# Altium schematic symbol library TI - ADC.SchLib: 2198 symbols (part 18 of 130) (continued)
## ADS1222IPWRG4
designator U?
24-Bit ADC with 2-Channel Diffrential Input Multiplexer, -40 to 85 degC, 14-pin SOP (PW14), Green (RoHS & no Sb/Br); Manufacturer: Texas Instruments; PartNumber: ADS1222IPWRG4; # Input Channels: 2; Analog Voltage AV/DD(Max)(V): 5.5; Analog Voltage AV/DD(Min)(V): 2.7; Architecture: Delta-Sigma; ENOB(Bits): 20; Interface: Serial SPI; Resolution(Bits): 24; Sample Rate (max)(SPS): 240; SubFamily: Precision ADC (<=10MSPS); DatasheetVersion: SBAS314B; PackageVersion: 4040064-3/G, 02/2011; PackageReference: PW14; PackageDescription: 14-Pin Plastic Small Outline, Body 5 x 4.4 mm, Pitch 0.65 mm; Supplier 1: Digi-Key; Supplier Part Number 1: ADS8344E-ND; Digital Supply(Max)(V): 5.5; Digital Supply(Min)(V): 2.7; Eco-Plan: Green (RoHS & no Sb/Br); Mounting Technology: Surface Mount; Code_JEDEC: MO-153; ComponentLink1Description: Manufacturer URL; ComponentLink1URL: http://www.ti.com/; ComponentLink2Description: Datasheet; ComponentLink2URL: http://www.ti.com/general/docs/lit/getliterature.tsp?genericPartNumber=ADS1222&fileType=pdf; ComponentLink3Description: Package Specification; ComponentLink3URL: http://www.ti.com/litv/pdf/mpds360
footprint TI-PW14_N (SOP, 14-Leads, Body 5x4.4mm, Pitch 0.65mm, IPC Medium Density)
footprint TI-PW14_L (SOP, 14-Leads, Body 5x4.4mm, Pitch 0.65mm, IPC High Density)
footprint TI-PW14_M (SOP, 14-Leads, Body 5x4.4mm, Pitch 0.65mm, IPC Low Density)
pins: 1 VDD (power) "Analog and digital power supply", 2 SCLK (in) "Serial clock input", 3 CLK (in) "System clock input", 4 ~{DRDY}/DOUT (out) "Dual-purpose output: Data ready: indicates valid data by going low. Data output: outputs data, MSB first, on the rising edge of SCLK", 5 MUX (in) "Selects analog input of mux", 6 TEMPEN (in) "Selects temperature sensor input from mux", 7 BUFEN (in) "Enables input buffer", 8 AINP2 (in) "Analog channel 2 positive input", 9 AINN2 (in) "Analog channel 2 negative input", 10 AINP1 (in) "Analog channel 1 positive input", 11 AINN1 (in) "Analog channel 1 negative input", 12 GND (power) "Analog and digital ground", 13 VREFN (in) "Negative reference input", 14 VREFP (in) "Positive reference input"

## ADS1222IPWT
designator U?
24-Bit ADC with 2-Channel Diffrential Input Multiplexer, -40 to 85 degC, 14-pin SOP (PW14), Green (RoHS & no Sb/Br); Manufacturer: Texas Instruments; PartNumber: ADS1222IPWT; # Input Channels: 2; Analog Voltage AV/DD(Max)(V): 5.5; Analog Voltage AV/DD(Min)(V): 2.7; Architecture: Delta-Sigma; ENOB(Bits): 20; Interface: Serial SPI; Resolution(Bits): 24; Sample Rate (max)(SPS): 240; SubFamily: Precision ADC (<=10MSPS); DatasheetVersion: SBAS314B; PackageVersion: 4040064-3/G, 02/2011; PackageReference: PW14; PackageDescription: 14-Pin Plastic Small Outline, Body 5 x 4.4 mm, Pitch 0.65 mm; Supplier 1: Digi-Key; Supplier Part Number 1: ADS8344E/2K5-ND; Digital Supply(Max)(V): 5.5; Digital Supply(Min)(V): 2.7; Eco-Plan: Green (RoHS & no Sb/Br); Mounting Technology: Surface Mount; Code_JEDEC: MO-153; ComponentLink1Description: Manufacturer URL; ComponentLink1URL: http://www.ti.com/; ComponentLink2Description: Datasheet; ComponentLink2URL: http://www.ti.com/general/docs/lit/getliterature.tsp?genericPartNumber=ADS1222&fileType=pdf; ComponentLink3Description: Package Specification; ComponentLink3URL: http://www.ti.com/litv/pdf/mpds360
footprint TI-PW14_N (SOP, 14-Leads, Body 5x4.4mm, Pitch 0.65mm, IPC Medium Density)
footprint TI-PW14_L (SOP, 14-Leads, Body 5x4.4mm, Pitch 0.65mm, IPC High Density)
footprint TI-PW14_M (SOP, 14-Leads, Body 5x4.4mm, Pitch 0.65mm, IPC Low Density)
pins: 1 VDD (power) "Analog and digital power supply", 2 SCLK (in) "Serial clock input", 3 CLK (in) "System clock input", 4 ~{DRDY}/DOUT (out) "Dual-purpose output: Data ready: indicates valid data by going low. Data output: outputs data, MSB first, on the rising edge of SCLK", 5 MUX (in) "Selects analog input of mux", 6 TEMPEN (in) "Selects temperature sensor input from mux", 7 BUFEN (in) "Enables input buffer", 8 AINP2 (in) "Analog channel 2 positive input", 9 AINN2 (in) "Analog channel 2 negative input", 10 AINP1 (in) "Analog channel 1 positive input", 11 AINN1 (in) "Analog channel 1 negative input", 12 GND (power) "Analog and digital ground", 13 VREFN (in) "Negative reference input", 14 VREFP (in) "Positive reference input"

## ADS1222IPWTG4
designator U?
24-Bit ADC with 2-Channel Diffrential Input Multiplexer, -40 to 85 degC, 14-pin SOP (PW14), Green (RoHS & no Sb/Br); Manufacturer: Texas Instruments; PartNumber: ADS1222IPWTG4; # Input Channels: 2; Analog Voltage AV/DD(Max)(V): 5.5; Analog Voltage AV/DD(Min)(V): 2.7; Architecture: Delta-Sigma; ENOB(Bits): 20; Interface: Serial SPI; Resolution(Bits): 24; Sample Rate (max)(SPS): 240; SubFamily: Precision ADC (<=10MSPS); DatasheetVersion: SBAS314B; PackageVersion: 4040064-3/G, 02/2011; PackageReference: PW14; PackageDescription: 14-Pin Plastic Small Outline, Body 5 x 4.4 mm, Pitch 0.65 mm; Supplier 1: Digi-Key; Supplier Part Number 1: ADS8344E/2K5G4-ND; Digital Supply(Max)(V): 5.5; Digital Supply(Min)(V): 2.7; Eco-Plan: Green (RoHS & no Sb/Br); Mounting Technology: Surface Mount; Code_JEDEC: MO-153; ComponentLink1Description: Manufacturer URL; ComponentLink1URL: http://www.ti.com/; ComponentLink2Description: Datasheet; ComponentLink2URL: http://www.ti.com/general/docs/lit/getliterature.tsp?genericPartNumber=ADS1222&fileType=pdf; ComponentLink3Description: Package Specification; ComponentLink3URL: http://www.ti.com/litv/pdf/mpds360
footprint TI-PW14_N (SOP, 14-Leads, Body 5x4.4mm, Pitch 0.65mm, IPC Medium Density)
footprint TI-PW14_L (SOP, 14-Leads, Body 5x4.4mm, Pitch 0.65mm, IPC High Density)
footprint TI-PW14_M (SOP, 14-Leads, Body 5x4.4mm, Pitch 0.65mm, IPC Low Density)
pins: 1 VDD (power) "Analog and digital power supply", 2 SCLK (in) "Serial clock input", 3 CLK (in) "System clock input", 4 ~{DRDY}/DOUT (out) "Dual-purpose output: Data ready: indicates valid data by going low. Data output: outputs data, MSB first, on the rising edge of SCLK", 5 MUX (in) "Selects analog input of mux", 6 TEMPEN (in) "Selects temperature sensor input from mux", 7 BUFEN (in) "Enables input buffer", 8 AINP2 (in) "Analog channel 2 positive input", 9 AINN2 (in) "Analog channel 2 negative input", 10 AINP1 (in) "Analog channel 1 positive input", 11 AINN1 (in) "Analog channel 1 negative input", 12 GND (power) "Analog and digital ground", 13 VREFN (in) "Negative reference input", 14 VREFP (in) "Positive reference input"

## ADS1224IPWR
designator U?
24-Bit, 240 SPS ADC with 4-Channel Differential Input Multiplexer, High-Z Buffer, Serial Output, -40 to 85 degC, 20-pin SOP (PW20), Green (RoHS & no Sb/Br); Manufacturer: Texas Instruments; PartNumber: ADS1224IPWR; # Input Channels: 4; Analog Voltage AV/DD(Max)(V): 5.5; Analog Voltage AV/DD(Min)(V): 2.7; Architecture: Delta-Sigma; Interface: Serial SPI; Resolution(Bits): 24; Sample Rate (max)(SPS): 240; SubFamily: Precision ADC (<=10MSPS); DatasheetVersion: SBAS286C; PackageVersion: 4040064-5/G, 02/2011; PackageReference: PW20; PackageDescription: 20-Pin Plastic Small Outline, Body 6.5 x 4.4 mm, Pitch 0.65 mm; Supplier 1: Digi-Key; Supplier Part Number 1: ADS8344EB-ND; Digital Supply(Max)(V): 5.5; Digital Supply(Min)(V): 2.7; Eco-Plan: Green (RoHS & no Sb/Br); Mounting Technology: Surface Mount; Code_JEDEC: MO-153; ComponentLink1Description: Manufacturer URL; ComponentLink1URL: http://www.ti.com/; ComponentLink2Description: Datasheet; ComponentLink2URL: http://www.ti.com/general/docs/lit/getliterature.tsp?genericPartNumber=ADS1224&fileType=pdf; ComponentLink3Description: Package Specification; ComponentLink3URL: http://www.ti.com.cn/cn/lit/ml/mpds362/mpds362.pdf
footprint TI-PW20_N (SOP, 20-Leads, Body 6.5x4.4mm, Pitch 0.65mm, IPC Medium Density)
footprint TI-PW20_L (SOP, 20-Leads, Body 6.5x4.4mm, Pitch 0.65mm, IPC High Density)
footprint TI-PW20_M (SOP, 20-Leads, Body 6.5x4.4mm, Pitch 0.65mm, IPC Low Density)
pins: 1 DVDD (power) "Digital power supply", 2 SCLK (in) "Serial clock input", 3 CLK (in) "System clock input", 4 ~{DRDY}/DOUT (out) "Dual-purpose output: Data Ready: indicates valid data by going low.Data Output: outputs data, MSB first, on the rising edge of SCLK.", 5 MUX0 (in) "Selects analog input of mux, bit 0", 6 MUX1 (in) "Selects analog input of mux, bit 1", 7 TEMPEN (in) "Selects temperature sensor input from mux", 8 BUFEN (in) "Enables input buffer", 9 AINP4 (in) "Analog channel 4 positive input", 10 AINN4 (in) "Analog channel 4 negative input", 11 AINP3 (in) "Analog channel 3 positive input", 12 AINN3 (in) "Analog channel 3 negative input", 13 AINP2 (in) "Analog channel 2 positive input", 14 AINN2 (in) "Analog channel 2 negative input", 15 AINP1 (in) "Analog channel 1 positive input", 16 AINN1 (in) "Analog channel 1 negative input", 17 GND (power) "Analog and digital ground", 18 VREFN (in) "Negative reference input", 19 VREFP (in) "Positive reference input", 20 AVDD (power) "Analog power supply"

## ADS1224IPWRG4
designator U?
24-Bit, 240 SPS ADC with 4-Channel Differential Input Multiplexer, High-Z Buffer, Serial Output, -40 to 85 degC, 20-pin SOP (PW20), Green (RoHS & no Sb/Br); Manufacturer: Texas Instruments; PartNumber: ADS1224IPWRG4; # Input Channels: 4; Analog Voltage AV/DD(Max)(V): 5.5; Analog Voltage AV/DD(Min)(V): 2.7; Architecture: Delta-Sigma; Interface: Serial SPI; Resolution(Bits): 24; Sample Rate (max)(SPS): 240; SubFamily: Precision ADC (<=10MSPS); DatasheetVersion: SBAS286C; PackageVersion: 4040064-5/G, 02/2011; PackageReference: PW20; PackageDescription: 20-Pin Plastic Small Outline, Body 6.5 x 4.4 mm, Pitch 0.65 mm; Supplier 1: Digi-Key; Supplier Part Number 1: ADS8344EB/2K5-ND; Digital Supply(Max)(V): 5.5; Digital Supply(Min)(V): 2.7; Eco-Plan: Green (RoHS & no Sb/Br); Mounting Technology: Surface Mount; Code_JEDEC: MO-153; ComponentLink1Description: Manufacturer URL; ComponentLink1URL: http://www.ti.com/; ComponentLink2Description: Datasheet; ComponentLink2URL: http://www.ti.com/general/docs/lit/getliterature.tsp?genericPartNumber=ADS1224&fileType=pdf; ComponentLink3Description: Package Specification; ComponentLink3URL: http://www.ti.com.cn/cn/lit/ml/mpds362/mpds362.pdf
footprint TI-PW20_N (SOP, 20-Leads, Body 6.5x4.4mm, Pitch 0.65mm, IPC Medium Density)
footprint TI-PW20_L (SOP, 20-Leads, Body 6.5x4.4mm, Pitch 0.65mm, IPC High Density)
footprint TI-PW20_M (SOP, 20-Leads, Body 6.5x4.4mm, Pitch 0.65mm, IPC Low Density)
pins: 1 DVDD (power) "Digital power supply", 2 SCLK (in) "Serial clock input", 3 CLK (in) "System clock input", 4 ~{DRDY}/DOUT (out) "Dual-purpose output: Data Ready: indicates valid data by going low.Data Output: outputs data, MSB first, on the rising edge of SCLK.", 5 MUX0 (in) "Selects analog input of mux, bit 0", 6 MUX1 (in) "Selects analog input of mux, bit 1", 7 TEMPEN (in) "Selects temperature sensor input from mux", 8 BUFEN (in) "Enables input buffer", 9 AINP4 (in) "Analog channel 4 positive input", 10 AINN4 (in) "Analog channel 4 negative input", 11 AINP3 (in) "Analog channel 3 positive input", 12 AINN3 (in) "Analog channel 3 negative input", 13 AINP2 (in) "Analog channel 2 positive input", 14 AINN2 (in) "Analog channel 2 negative input", 15 AINP1 (in) "Analog channel 1 positive input", 16 AINN1 (in) "Analog channel 1 negative input", 17 GND (power) "Analog and digital ground", 18 VREFN (in) "Negative reference input", 19 VREFP (in) "Positive reference input", 20 AVDD (power) "Analog power supply"

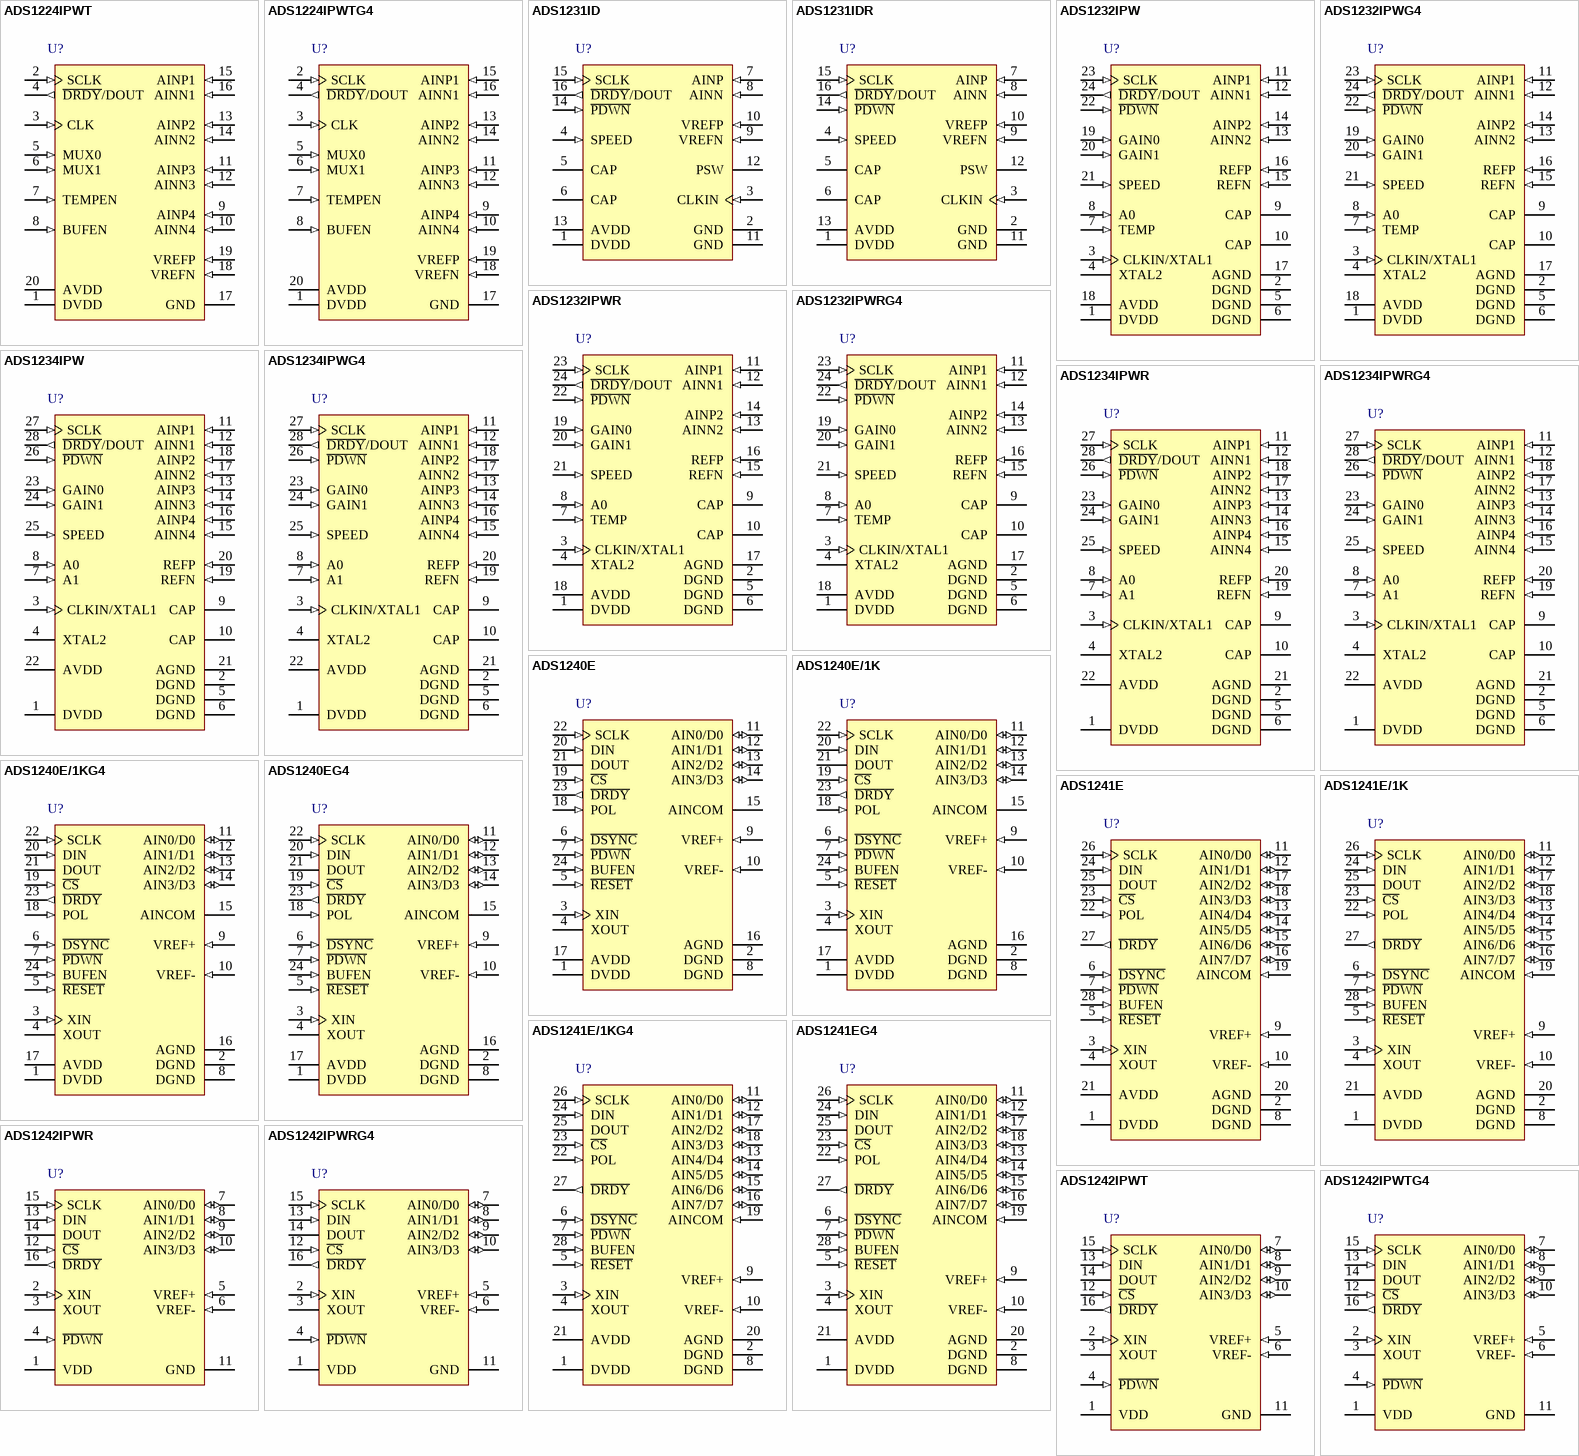
[diagram p20: symbols ADS1224IPWT to ADS1242IPWTG4]

## ADS1224IPWT
designator U?
24-Bit, 240 SPS ADC with 4-Channel Differential Input Multiplexer, High-Z Buffer, Serial Output, -40 to 85 degC, 20-pin SOP (PW20), Green (RoHS & no Sb/Br); Manufacturer: Texas Instruments; PartNumber: ADS1224IPWT; # Input Channels: 4; Analog Voltage AV/DD(Max)(V): 5.5; Analog Voltage AV/DD(Min)(V): 2.7; Architecture: Delta-Sigma; Interface: Serial SPI; Resolution(Bits): 24; Sample Rate (max)(SPS): 240; SubFamily: Precision ADC (<=10MSPS); DatasheetVersion: SBAS286C; PackageVersion: 4040064-5/G, 02/2011; PackageReference: PW20; PackageDescription: 20-Pin Plastic Small Outline, Body 6.5 x 4.4 mm, Pitch 0.65 mm; Supplier 1: Digi-Key; Supplier Part Number 1: ADS8344EB/2K5G4-ND; Digital Supply(Max)(V): 5.5; Digital Supply(Min)(V): 2.7; Eco-Plan: Green (RoHS & no Sb/Br); Mounting Technology: Surface Mount; Code_JEDEC: MO-153; ComponentLink1Description: Manufacturer URL; ComponentLink1URL: http://www.ti.com/; ComponentLink2Description: Datasheet; ComponentLink2URL: http://www.ti.com/general/docs/lit/getliterature.tsp?genericPartNumber=ADS1224&fileType=pdf; ComponentLink3Description: Package Specification; ComponentLink3URL: http://www.ti.com.cn/cn/lit/ml/mpds362/mpds362.pdf
footprint TI-PW20_N (SOP, 20-Leads, Body 6.5x4.4mm, Pitch 0.65mm, IPC Medium Density)
footprint TI-PW20_L (SOP, 20-Leads, Body 6.5x4.4mm, Pitch 0.65mm, IPC High Density)
footprint TI-PW20_M (SOP, 20-Leads, Body 6.5x4.4mm, Pitch 0.65mm, IPC Low Density)
pins: 1 DVDD (power) "Digital power supply", 2 SCLK (in) "Serial clock input", 3 CLK (in) "System clock input", 4 ~{DRDY}/DOUT (out) "Dual-purpose output: Data Ready: indicates valid data by going low.Data Output: outputs data, MSB first, on the rising edge of SCLK.", 5 MUX0 (in) "Selects analog input of mux, bit 0", 6 MUX1 (in) "Selects analog input of mux, bit 1", 7 TEMPEN (in) "Selects temperature sensor input from mux", 8 BUFEN (in) "Enables input buffer", 9 AINP4 (in) "Analog channel 4 positive input", 10 AINN4 (in) "Analog channel 4 negative input", 11 AINP3 (in) "Analog channel 3 positive input", 12 AINN3 (in) "Analog channel 3 negative input", 13 AINP2 (in) "Analog channel 2 positive input", 14 AINN2 (in) "Analog channel 2 negative input", 15 AINP1 (in) "Analog channel 1 positive input", 16 AINN1 (in) "Analog channel 1 negative input", 17 GND (power) "Analog and digital ground", 18 VREFN (in) "Negative reference input", 19 VREFP (in) "Positive reference input", 20 AVDD (power) "Analog power supply"

## ADS1224IPWTG4
designator U?
24-Bit, 240 SPS ADC with 4-Channel Differential Input Multiplexer, High-Z Buffer, Serial Output, -40 to 85 degC, 20-pin SOP (PW20), Green (RoHS & no Sb/Br); Manufacturer: Texas Instruments; PartNumber: ADS1224IPWTG4; # Input Channels: 4; Analog Voltage AV/DD(Max)(V): 5.5; Analog Voltage AV/DD(Min)(V): 2.7; Architecture: Delta-Sigma; Interface: Serial SPI; Resolution(Bits): 24; Sample Rate (max)(SPS): 240; SubFamily: Precision ADC (<=10MSPS); DatasheetVersion: SBAS286C; PackageVersion: 4040064-5/G, 02/2011; PackageReference: PW20; PackageDescription: 20-Pin Plastic Small Outline, Body 6.5 x 4.4 mm, Pitch 0.65 mm; Supplier 1: Digi-Key; Supplier Part Number 1: ADS8344EBG4-ND; Digital Supply(Max)(V): 5.5; Digital Supply(Min)(V): 2.7; Eco-Plan: Green (RoHS & no Sb/Br); Mounting Technology: Surface Mount; Code_JEDEC: MO-153; ComponentLink1Description: Manufacturer URL; ComponentLink1URL: http://www.ti.com/; ComponentLink2Description: Datasheet; ComponentLink2URL: http://www.ti.com/general/docs/lit/getliterature.tsp?genericPartNumber=ADS1224&fileType=pdf; ComponentLink3Description: Package Specification; ComponentLink3URL: http://www.ti.com.cn/cn/lit/ml/mpds362/mpds362.pdf
footprint TI-PW20_N (SOP, 20-Leads, Body 6.5x4.4mm, Pitch 0.65mm, IPC Medium Density)
footprint TI-PW20_L (SOP, 20-Leads, Body 6.5x4.4mm, Pitch 0.65mm, IPC High Density)
footprint TI-PW20_M (SOP, 20-Leads, Body 6.5x4.4mm, Pitch 0.65mm, IPC Low Density)
pins: 1 DVDD (power) "Digital power supply", 2 SCLK (in) "Serial clock input", 3 CLK (in) "System clock input", 4 ~{DRDY}/DOUT (out) "Dual-purpose output: Data Ready: indicates valid data by going low.Data Output: outputs data, MSB first, on the rising edge of SCLK.", 5 MUX0 (in) "Selects analog input of mux, bit 0", 6 MUX1 (in) "Selects analog input of mux, bit 1", 7 TEMPEN (in) "Selects temperature sensor input from mux", 8 BUFEN (in) "Enables input buffer", 9 AINP4 (in) "Analog channel 4 positive input", 10 AINN4 (in) "Analog channel 4 negative input", 11 AINP3 (in) "Analog channel 3 positive input", 12 AINN3 (in) "Analog channel 3 negative input", 13 AINP2 (in) "Analog channel 2 positive input", 14 AINN2 (in) "Analog channel 2 negative input", 15 AINP1 (in) "Analog channel 1 positive input", 16 AINN1 (in) "Analog channel 1 negative input", 17 GND (power) "Analog and digital ground", 18 VREFN (in) "Negative reference input", 19 VREFP (in) "Positive reference input", 20 AVDD (power) "Analog power supply"

## ADS1231ID
designator U?
Low-Noise, 24-Bit ADC, -40 to 85 degC, 16-pin SOIC (D16), Green (RoHS & no Sb/Br); Manufacturer: Texas Instruments; PartNumber: ADS1231ID; # Input Channels: 1; Analog Voltage AV/DD(Max)(V): 5.3; Analog Voltage AV/DD(Min)(V): 2.7; Architecture: Delta-Sigma; ENOB(Bits): 18.5; Interface: Serial SPI; Resolution(Bits): 24; Sample Rate (max)(SPS): 80; SubFamily: Precision ADC (<=10MSPS); DatasheetVersion: SBAS414C; PackageVersion: 4040047-6/M, 06/2011; PackageReference: D16; PackageDescription: 16-Pin Plastic Small Outline, Body 9.9 x 3.9 mm, Pitch 1.27 mm; Supplier 1: Digi-Key; Supplier Part Number 1: ADS8344EG4-ND; Digital Supply(Max)(V): 5.3; Digital Supply(Min)(V): 2.7; Eco-Plan: Green (RoHS & no Sb/Br); Mounting Technology: Surface Mount; Code_JEDEC: MS-012; ComponentLink1Description: Manufacturer URL; ComponentLink1URL: http://www.ti.com/; ComponentLink2Description: Datasheet; ComponentLink2URL: http://www.ti.com/general/docs/lit/getliterature.tsp?genericPartNumber=ADS1231&fileType=pdf; ComponentLink3Description: Package Specification; ComponentLink3URL: http://www.ti.com/litv/pdf/mpds178g
footprint TI-D16_N (SOIC, 16-Leads, Body 9.9x3.9mm, Pitch 1.27mm, IPC Medium Density)
footprint TI-D16_L (SOIC, 16-Leads, Body 9.9x3.9mm, Pitch 1.27mm, IPC High Density)
footprint TI-D16_M (SOIC, 16-Leads, Body 9.9x3.9mm, Pitch 1.27mm, IPC Low Density)
pins: 1 DVDD (power) "Digital power supply", 2 GND (power) "Ground for digital and analog supplies", 3 CLKIN (in) "External clock input: typically 4.9152MHz. Tie low to activate internal oscillator.", 4 SPEED (in) "Data rate select:", 5 CAP "Gain amplifier bypass capacitor connection", 6 CAP "Gain amplifier bypass capacitor connection", 7 AINP (in) "Positive analog input", 8 AINN (in) "Negative analog input", 9 VREFN (in) "Negative reference input", 10 VREFP (in) "Positive reference input", 11 GND (power) "Ground for digital and analog supplies", 12 PSW (power) "Low-side power switch", 13 AVDD (power) "Analog power supply", 14 ~{PDWN} (in) "Power-down: holding this pin low powers down the entire converter and resets the ADC.", 15 SCLK (in) "Serial clock: clock out data on the rising edge. Also used to initiate Standby mode. See the Standby Mode section for more details.", 16 ~{DRDY}/DOUT (out) "Dual-purpose output:Data ready: indicates valid data by going low.Data output: outputs data, MSB first, on the first rising edge of SCLK."

## ADS1231IDR
designator U?
Low-Noise, 24-Bit ADC, -40 to 85 degC, 16-pin SOIC (D16), Green (RoHS & no Sb/Br); Manufacturer: Texas Instruments; PartNumber: ADS1231IDR; # Input Channels: 1; Analog Voltage AV/DD(Max)(V): 5.3; Analog Voltage AV/DD(Min)(V): 2.7; Architecture: Delta-Sigma; ENOB(Bits): 18.5; Interface: Serial SPI; Resolution(Bits): 24; Sample Rate (max)(SPS): 80; SubFamily: Precision ADC (<=10MSPS); DatasheetVersion: SBAS414C; PackageVersion: 4040047-6/M, 06/2011; PackageReference: D16; PackageDescription: 16-Pin Plastic Small Outline, Body 9.9 x 3.9 mm, Pitch 1.27 mm; Supplier 1: Digi-Key; Supplier Part Number 1: ADS1254E-ND; Digital Supply(Max)(V): 5.3; Digital Supply(Min)(V): 2.7; Eco-Plan: Green (RoHS & no Sb/Br); Mounting Technology: Surface Mount; Code_JEDEC: MS-012; ComponentLink1Description: Manufacturer URL; ComponentLink1URL: http://www.ti.com/; ComponentLink2Description: Datasheet; ComponentLink2URL: http://www.ti.com/general/docs/lit/getliterature.tsp?genericPartNumber=ADS1231&fileType=pdf; ComponentLink3Description: Package Specification; ComponentLink3URL: http://www.ti.com/litv/pdf/mpds178g
footprint TI-D16_N (SOIC, 16-Leads, Body 9.9x3.9mm, Pitch 1.27mm, IPC Medium Density)
footprint TI-D16_L (SOIC, 16-Leads, Body 9.9x3.9mm, Pitch 1.27mm, IPC High Density)
footprint TI-D16_M (SOIC, 16-Leads, Body 9.9x3.9mm, Pitch 1.27mm, IPC Low Density)
pins: 1 DVDD (power) "Digital power supply", 2 GND (power) "Ground for digital and analog supplies", 3 CLKIN (in) "External clock input: typically 4.9152MHz. Tie low to activate internal oscillator.", 4 SPEED (in) "Data rate select:", 5 CAP "Gain amplifier bypass capacitor connection", 6 CAP "Gain amplifier bypass capacitor connection", 7 AINP (in) "Positive analog input", 8 AINN (in) "Negative analog input", 9 VREFN (in) "Negative reference input", 10 VREFP (in) "Positive reference input", 11 GND (power) "Ground for digital and analog supplies", 12 PSW (power) "Low-side power switch", 13 AVDD (power) "Analog power supply", 14 ~{PDWN} (in) "Power-down: holding this pin low powers down the entire converter and resets the ADC.", 15 SCLK (in) "Serial clock: clock out data on the rising edge. Also used to initiate Standby mode. See the Standby Mode section for more details.", 16 ~{DRDY}/DOUT (out) "Dual-purpose output:Data ready: indicates valid data by going low.Data output: outputs data, MSB first, on the first rising edge of SCLK."

## ADS1232IPW
designator U?
24-Bit, Ultra Low-Noise ADC, -40 to 105 degC, 24-pin SOP (PW24), Green (RoHS & no Sb/Br); Manufacturer: Texas Instruments; PartNumber: ADS1232IPW; # Input Channels: 2; Analog Voltage AV/DD(Max)(V): 5.3; Analog Voltage AV/DD(Min)(V): 2.7; Architecture: Delta-Sigma; ENOB(Bits): 21.8; Interface: Serial SPI; Resolution(Bits): 24; Sample Rate (max)(SPS): 80; SubFamily: Precision ADC (<=10MSPS); DatasheetVersion: SBAS350F; PackageVersion: 4040064-6/G, 02/2011; PackageReference: PW24; PackageDescription: 24-Pin Plastic Small Outline, Body 7.8 x 4.4 mm, Pitch 0.65 mm; Supplier 1: Digi-Key; Supplier Part Number 1: ADS1224IPWR-ND; Digital Supply(Max)(V): 5.3; Digital Supply(Min)(V): 2.7; Eco-Plan: Green (RoHS & no Sb/Br); Mounting Technology: Surface Mount; Code_JEDEC: MO-153; ComponentLink1Description: Manufacturer URL; ComponentLink1URL: http://www.ti.com/; ComponentLink2Description: Datasheet; ComponentLink2URL: http://www.ti.com/general/docs/lit/getliterature.tsp?genericPartNumber=ADS1232&fileType=pdf; ComponentLink3Description: Package Specification; ComponentLink3URL: http://www.ti.com/litv/pdf/mpds363
footprint TI-PW24_N (SOP, 24-Leads, Body 7.8x4.4mm, Pitch 0.65mm, IPC Medium Density)
footprint TI-PW24_L (SOP, 24-Leads, Body 7.8x4.4mm, Pitch 0.65mm, IPC High Density)
footprint TI-PW24_M (SOP, 24-Leads, Body 7.8x4.4mm, Pitch 0.65mm, IPC Low Density)
pins: 1 DVDD (power) "Digital Power Supply: 2.7V to 5.3V", 2 DGND (power) "Digital Ground", 3 CLKIN/XTAL1 (in) "External Clock Input: typically 4.9152MHz. Tie low to activate internal oscillator. Can also use external crystal across CLKIN/XTAL1 and XTAL2 pins. See text for more details.", 4 XTAL2 "External crystal connection", 5 DGND (power) "Digital Ground", 6 DGND (power) "Digital Ground", 7 TEMP (in) "Onboard Temperature Diode Enable", 8 A0 (in) "Input Mux Select Input pin (LSB)", 9 CAP "Gain Amp Bypass Capacitor Connection", 10 CAP "Gain Amp Bypass Capacitor Connection", 11 AINP1 (in) "Positive Analog Input Channel 1", 12 AINN1 (in) "Negative Analog Input Channel 1", 13 AINN2 (in) "Negative Analog Input Channel 2", 14 AINP2 (in) "Positive Analog Input Channel 2", 15 REFN (in) "Negative Reference Input", 16 REFP (in) "Positive Reference Input", 17 AGND (power) "Analog Ground", 18 AVDD (power) "Analog Power Supply, 2.7V to 5.3V", 19 GAIN0 (in) "Gain Select", 20 GAIN1 (in) "Gain Select", 21 SPEED (in) "Data Rate Select", 22 ~{PDWN} (in) "Power-Down: Holding this pin low powers down the entire converter and resets the ADC.", 23 SCLK (in) "Serial Clock: Clock out data on the rising edge.Also used to initiate Offset Calibration and Sleep modes. See text for more details.", 24 ~{DRDY}/DOUT (out) "Dual-Purpose Output Data Ready: Indicates valid data by going low.Data Output: Outputs data, MSB first, on the first rising edge of SCLK."

## ADS1232IPWG4
designator U?
24-Bit, Ultra Low-Noise ADC, -40 to 105 degC, 24-pin SOP (PW24), Green (RoHS & no Sb/Br); Manufacturer: Texas Instruments; PartNumber: ADS1232IPWG4; # Input Channels: 2; Analog Voltage AV/DD(Max)(V): 5.3; Analog Voltage AV/DD(Min)(V): 2.7; Architecture: Delta-Sigma; ENOB(Bits): 21.8; Interface: Serial SPI; Resolution(Bits): 24; Sample Rate (max)(SPS): 80; SubFamily: Precision ADC (<=10MSPS); DatasheetVersion: SBAS350F; PackageVersion: 4040064-6/G, 02/2011; PackageReference: PW24; PackageDescription: 24-Pin Plastic Small Outline, Body 7.8 x 4.4 mm, Pitch 0.65 mm; Supplier 1: Digi-Key; Supplier Part Number 1: ADS1224IPWRG4-ND; Digital Supply(Max)(V): 5.3; Digital Supply(Min)(V): 2.7; Eco-Plan: Green (RoHS & no Sb/Br); Mounting Technology: Surface Mount; Code_JEDEC: MO-153; ComponentLink1Description: Manufacturer URL; ComponentLink1URL: http://www.ti.com/; ComponentLink2Description: Datasheet; ComponentLink2URL: http://www.ti.com/general/docs/lit/getliterature.tsp?genericPartNumber=ADS1232&fileType=pdf; ComponentLink3Description: Package Specification; ComponentLink3URL: http://www.ti.com/litv/pdf/mpds363
footprint TI-PW24_N (SOP, 24-Leads, Body 7.8x4.4mm, Pitch 0.65mm, IPC Medium Density)
footprint TI-PW24_L (SOP, 24-Leads, Body 7.8x4.4mm, Pitch 0.65mm, IPC High Density)
footprint TI-PW24_M (SOP, 24-Leads, Body 7.8x4.4mm, Pitch 0.65mm, IPC Low Density)
pins: 1 DVDD (power) "Digital Power Supply: 2.7V to 5.3V", 2 DGND (power) "Digital Ground", 3 CLKIN/XTAL1 (in) "External Clock Input: typically 4.9152MHz. Tie low to activate internal oscillator. Can also use external crystal across CLKIN/XTAL1 and XTAL2 pins. See text for more details.", 4 XTAL2 "External crystal connection", 5 DGND (power) "Digital Ground", 6 DGND (power) "Digital Ground", 7 TEMP (in) "Onboard Temperature Diode Enable", 8 A0 (in) "Input Mux Select Input pin (LSB)", 9 CAP "Gain Amp Bypass Capacitor Connection", 10 CAP "Gain Amp Bypass Capacitor Connection", 11 AINP1 (in) "Positive Analog Input Channel 1", 12 AINN1 (in) "Negative Analog Input Channel 1", 13 AINN2 (in) "Negative Analog Input Channel 2", 14 AINP2 (in) "Positive Analog Input Channel 2", 15 REFN (in) "Negative Reference Input", 16 REFP (in) "Positive Reference Input", 17 AGND (power) "Analog Ground", 18 AVDD (power) "Analog Power Supply, 2.7V to 5.3V", 19 GAIN0 (in) "Gain Select", 20 GAIN1 (in) "Gain Select", 21 SPEED (in) "Data Rate Select", 22 ~{PDWN} (in) "Power-Down: Holding this pin low powers down the entire converter and resets the ADC.", 23 SCLK (in) "Serial Clock: Clock out data on the rising edge.Also used to initiate Offset Calibration and Sleep modes. See text for more details.", 24 ~{DRDY}/DOUT (out) "Dual-Purpose Output Data Ready: Indicates valid data by going low.Data Output: Outputs data, MSB first, on the first rising edge of SCLK."

## ADS1232IPWR
designator U?
24-Bit, Ultra Low-Noise ADC, -40 to 105 degC, 24-pin SOP (PW24), Green (RoHS & no Sb/Br); Manufacturer: Texas Instruments; PartNumber: ADS1232IPWR; # Input Channels: 2; Analog Voltage AV/DD(Max)(V): 5.3; Analog Voltage AV/DD(Min)(V): 2.7; Architecture: Delta-Sigma; ENOB(Bits): 21.8; Interface: Serial SPI; Resolution(Bits): 24; Sample Rate (max)(SPS): 80; SubFamily: Precision ADC (<=10MSPS); DatasheetVersion: SBAS350F; PackageVersion: 4040064-6/G, 02/2011; PackageReference: PW24; PackageDescription: 24-Pin Plastic Small Outline, Body 7.8 x 4.4 mm, Pitch 0.65 mm; Supplier 1: Digi-Key; Supplier Part Number 1: 296-16923-2-ND; Digital Supply(Max)(V): 5.3; Digital Supply(Min)(V): 2.7; Eco-Plan: Green (RoHS & no Sb/Br); Mounting Technology: Surface Mount; Code_JEDEC: MO-153; ComponentLink1Description: Manufacturer URL; ComponentLink1URL: http://www.ti.com/; ComponentLink2Description: Datasheet; ComponentLink2URL: http://www.ti.com/general/docs/lit/getliterature.tsp?genericPartNumber=ADS1232&fileType=pdf; ComponentLink3Description: Package Specification; ComponentLink3URL: http://www.ti.com/litv/pdf/mpds363
footprint TI-PW24_N (SOP, 24-Leads, Body 7.8x4.4mm, Pitch 0.65mm, IPC Medium Density)
footprint TI-PW24_L (SOP, 24-Leads, Body 7.8x4.4mm, Pitch 0.65mm, IPC High Density)
footprint TI-PW24_M (SOP, 24-Leads, Body 7.8x4.4mm, Pitch 0.65mm, IPC Low Density)
pins: 1 DVDD (power) "Digital Power Supply: 2.7V to 5.3V", 2 DGND (power) "Digital Ground", 3 CLKIN/XTAL1 (in) "External Clock Input: typically 4.9152MHz. Tie low to activate internal oscillator. Can also use external crystal across CLKIN/XTAL1 and XTAL2 pins. See text for more details.", 4 XTAL2 "External crystal connection", 5 DGND (power) "Digital Ground", 6 DGND (power) "Digital Ground", 7 TEMP (in) "Onboard Temperature Diode Enable", 8 A0 (in) "Input Mux Select Input pin (LSB)", 9 CAP "Gain Amp Bypass Capacitor Connection", 10 CAP "Gain Amp Bypass Capacitor Connection", 11 AINP1 (in) "Positive Analog Input Channel 1", 12 AINN1 (in) "Negative Analog Input Channel 1", 13 AINN2 (in) "Negative Analog Input Channel 2", 14 AINP2 (in) "Positive Analog Input Channel 2", 15 REFN (in) "Negative Reference Input", 16 REFP (in) "Positive Reference Input", 17 AGND (power) "Analog Ground", 18 AVDD (power) "Analog Power Supply, 2.7V to 5.3V", 19 GAIN0 (in) "Gain Select", 20 GAIN1 (in) "Gain Select", 21 SPEED (in) "Data Rate Select", 22 ~{PDWN} (in) "Power-Down: Holding this pin low powers down the entire converter and resets the ADC.", 23 SCLK (in) "Serial Clock: Clock out data on the rising edge.Also used to initiate Offset Calibration and Sleep modes. See text for more details.", 24 ~{DRDY}/DOUT (out) "Dual-Purpose Output Data Ready: Indicates valid data by going low.Data Output: Outputs data, MSB first, on the first rising edge of SCLK."

## ADS1232IPWRG4
designator U?
24-Bit, Ultra Low-Noise ADC, -40 to 105 degC, 24-pin SOP (PW24), Green (RoHS & no Sb/Br); Manufacturer: Texas Instruments; PartNumber: ADS1232IPWRG4; # Input Channels: 2; Analog Voltage AV/DD(Max)(V): 5.3; Analog Voltage AV/DD(Min)(V): 2.7; Architecture: Delta-Sigma; ENOB(Bits): 21.8; Interface: Serial SPI; Resolution(Bits): 24; Sample Rate (max)(SPS): 80; SubFamily: Precision ADC (<=10MSPS); DatasheetVersion: SBAS350F; PackageVersion: 4040064-6/G, 02/2011; PackageReference: PW24; PackageDescription: 24-Pin Plastic Small Outline, Body 7.8 x 4.4 mm, Pitch 0.65 mm; Supplier 1: Digi-Key; Supplier Part Number 1: ADS1224IPWTG4-ND; Digital Supply(Max)(V): 5.3; Digital Supply(Min)(V): 2.7; Eco-Plan: Green (RoHS & no Sb/Br); Mounting Technology: Surface Mount; Code_JEDEC: MO-153; ComponentLink1Description: Manufacturer URL; ComponentLink1URL: http://www.ti.com/; ComponentLink2Description: Datasheet; ComponentLink2URL: http://www.ti.com/general/docs/lit/getliterature.tsp?genericPartNumber=ADS1232&fileType=pdf; ComponentLink3Description: Package Specification; ComponentLink3URL: http://www.ti.com/litv/pdf/mpds363
footprint TI-PW24_N (SOP, 24-Leads, Body 7.8x4.4mm, Pitch 0.65mm, IPC Medium Density)
footprint TI-PW24_L (SOP, 24-Leads, Body 7.8x4.4mm, Pitch 0.65mm, IPC High Density)
footprint TI-PW24_M (SOP, 24-Leads, Body 7.8x4.4mm, Pitch 0.65mm, IPC Low Density)
pins: 1 DVDD (power) "Digital Power Supply: 2.7V to 5.3V", 2 DGND (power) "Digital Ground", 3 CLKIN/XTAL1 (in) "External Clock Input: typically 4.9152MHz. Tie low to activate internal oscillator. Can also use external crystal across CLKIN/XTAL1 and XTAL2 pins. See text for more details.", 4 XTAL2 "External crystal connection", 5 DGND (power) "Digital Ground", 6 DGND (power) "Digital Ground", 7 TEMP (in) "Onboard Temperature Diode Enable", 8 A0 (in) "Input Mux Select Input pin (LSB)", 9 CAP "Gain Amp Bypass Capacitor Connection", 10 CAP "Gain Amp Bypass Capacitor Connection", 11 AINP1 (in) "Positive Analog Input Channel 1", 12 AINN1 (in) "Negative Analog Input Channel 1", 13 AINN2 (in) "Negative Analog Input Channel 2", 14 AINP2 (in) "Positive Analog Input Channel 2", 15 REFN (in) "Negative Reference Input", 16 REFP (in) "Positive Reference Input", 17 AGND (power) "Analog Ground", 18 AVDD (power) "Analog Power Supply, 2.7V to 5.3V", 19 GAIN0 (in) "Gain Select", 20 GAIN1 (in) "Gain Select", 21 SPEED (in) "Data Rate Select", 22 ~{PDWN} (in) "Power-Down: Holding this pin low powers down the entire converter and resets the ADC.", 23 SCLK (in) "Serial Clock: Clock out data on the rising edge.Also used to initiate Offset Calibration and Sleep modes. See text for more details.", 24 ~{DRDY}/DOUT (out) "Dual-Purpose Output Data Ready: Indicates valid data by going low.Data Output: Outputs data, MSB first, on the first rising edge of SCLK."

## ADS1234IPW
designator U?
24-Bit, Ultra Low-Noise ADC, -40 to 105 degC, 28-pin SOP (PW28), Green (RoHS & no Sb/Br); Manufacturer: Texas Instruments; PartNumber: ADS1234IPW; # Input Channels: 4; Analog Voltage AV/DD(Max)(V): 5.3; Analog Voltage AV/DD(Min)(V): 2.7; Architecture: Delta-Sigma; ENOB(Bits): 23.5; Interface: Serial SPI; Resolution(Bits): 24; Sample Rate (max)(SPS): 80; SubFamily: Precision ADC (<=10MSPS); DatasheetVersion: SBAS350F; PackageVersion: 4040064-7/G, 02/2011; PackageReference: PW28; PackageDescription: 28-Pin Plastic Small Outline, Body 9.7 x 4.4 mm, Pitch 0.65 mm; Supplier 1: Digi-Key; Supplier Part Number 1: 296-13000-5-ND; Digital Supply(Max)(V): 5.3; Digital Supply(Min)(V): 2.7; Eco-Plan: Green (RoHS & no Sb/Br); Mounting Technology: Surface Mount; Code_JEDEC: MO-153; ComponentLink1Description: Manufacturer URL; ComponentLink1URL: http://www.ti.com/; ComponentLink2Description: Datasheet; ComponentLink2URL: http://www.ti.com/general/docs/lit/getliterature.tsp?genericPartNumber=ADS1234&fileType=pdf; ComponentLink3Description: Package Specification; ComponentLink3URL: http://www.ti.com/litv/pdf/mpds364
footprint TI-PW28_N (SOP, 28-Leads, Body 9.7x4.4mm, Pitch 0.65mm, IPC Medium Density)
footprint TI-PW28_L (SOP, 28-Leads, Body 9.7x4.4mm, Pitch 0.65mm, IPC High Density)
footprint TI-PW28_M (SOP, 28-Leads, Body 9.7x4.4mm, Pitch 0.65mm, IPC Low Density)
pins: 1 DVDD (power) "Digital Power Supply: 2.7V to 5.3V", 2 DGND (power) "Digital Ground", 3 CLKIN/XTAL1 (in) "External Clock Input: typically 4.9152MHz. Tie low to activate internal oscillator. Can also use external crystal across CLKIN/XTAL1 and XTAL2 pins. See text for more details.", 4 XTAL2 "External crystal connection", 5 DGND (power) "Digital Ground", 6 DGND (power) "Digital Ground", 7 A1 (in) "Input Mux Select Input pin (MSB)", 8 A0 (in) "Input Mux Select Input pin (LSB)", 9 CAP "Gain Amp Bypass Capacitor Connection", 10 CAP "Gain Amp Bypass Capacitor Connection", 11 AINP1 (in) "Positive Analog Input Channel 1", 12 AINN1 (in) "Negative Analog Input Channel 1", 13 AINP3 (in) "Positive Analog Input Channel 3", 14 AINN3 (in) "Negative Analog Input Channel 3", 15 AINN4 (in) "Negative Analog Input Channel 4", 16 AINP4 (in) "Positive Analog Input Channel 4", 17 AINN2 (in) "Negative Analog Input Channel 2", 18 AINP2 (in) "Positive Analog Input Channel 2", 19 REFN (in) "Negative Reference Input", 20 REFP (in) "Positive Reference Input", 21 AGND (power) "Analog Ground", 22 AVDD (power) "Analog Power Supply, 2.7V to 5.3V", 23 GAIN0 (in) "Gain Select", 24 GAIN1 (in) "Gain Select", 25 SPEED (in) "Data Rate Select", 26 ~{PDWN} (in) "Power-Down: Holding this pin low powers down the entire converter and resets the ADC.", 27 SCLK (in) "Serial Clock: Clock out data on the rising edge. Also used to initiate Offset Calibration and Sleep modes. See text for more details.", 28 ~{DRDY}/DOUT (out) "Dual-Purpose Output: Data Ready: Indicates valid data by going low. Data Output: Outputs data, MSB first, on the first rising edge of SCLK."